# Altium footprint library OT Library.PcbLib: 396 footprints (part 15 of 25)
Each footprint in its own frame and in the unit in brackets; x right, y up, seen from the top. Pads: shape width x height; smd on the part's side, far side on the other; paste and mask are expansions set on the pad; w line width, h text height; cw(c..) or ccw(c..) is an arc to the next point about the centre after c.
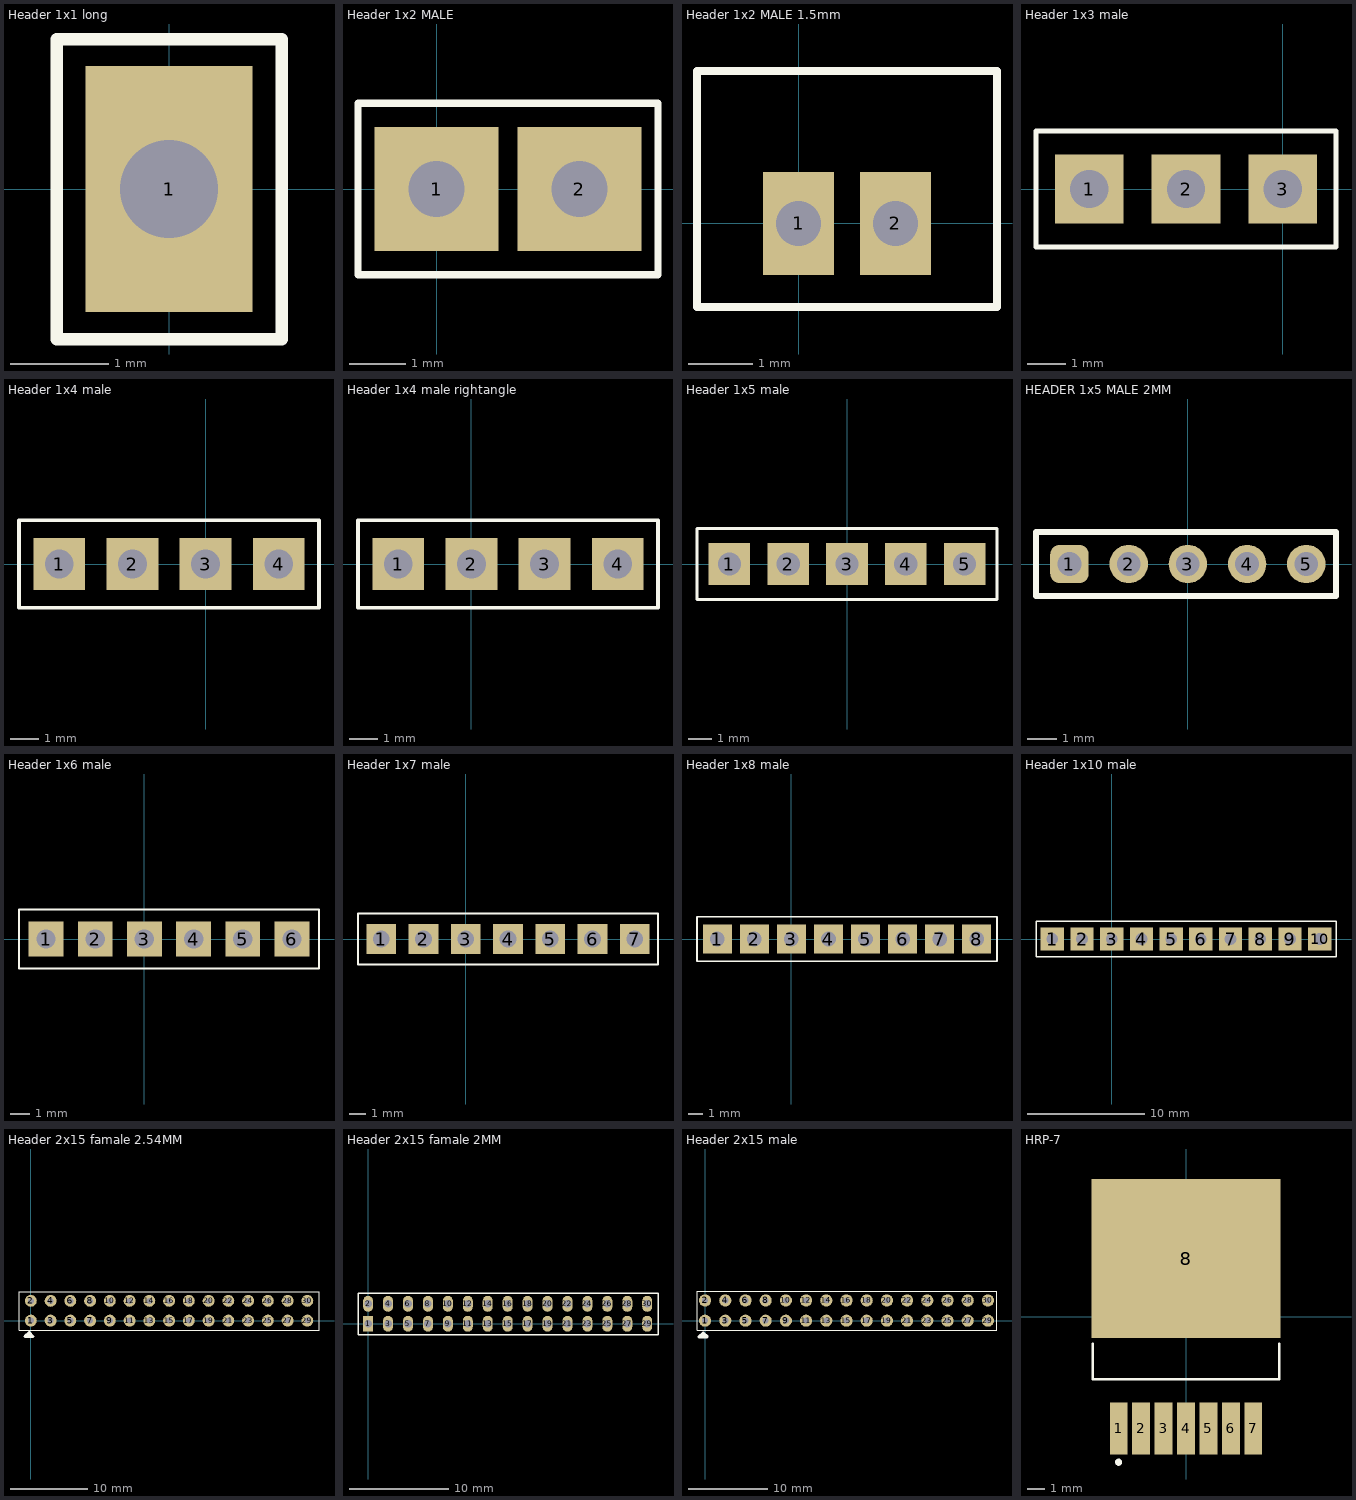
[diagram p14: the footprints below, top view; thin cyan lines are the x and y axes]

## Header 1x1 long [mm] "2.54mm"
pads (1):
  rect 1.7x2.5 hole 1: 1(0,0)
Top Overlay:
  lines w0.127: -1.143,-1.524 -1.143,1.524 1.143,1.524 1.143,-1.524 -1.143,-1.524

## Header 1x2 MALE [mm] "2.54mm"
pads (2):
  rect 2.2x2.2 hole 1: 1(0,0) 2(2.54,0)
Top Overlay:
  lines w0.127: -1.397,-1.524 3.937,-1.524 3.937,1.524 -1.397,1.524 -1.397,-1.524
3D body: height 8.57, standoff -2.97, extent -1.27,-1.27 3.81,1.27

## Header 1x2 MALE 1.5mm [mm] "1.5mm"
pads (2):
  rect 1.1x1.6 hole 0.7: 1(0,0) 2(1.5,0)
Top Overlay:
  lines w0.127: -1.575,-1.295 -1.575,2.362 3.073,2.362 3.073,-1.295 -1.575,-1.295
3D body: height 4.5, standoff -2.7, extent -1.503,-1.214 2.997,2.286

## Header 1x3 male [mm] "2.54mm"
pads (3):
  rect 1.8x1.8 hole 1: 1(-5.08,0) 2(-2.54,0) 3(0,0)
Top Overlay:
  lines w0.127: -6.477,-1.524 -6.477,1.524 1.397,1.524 1.397,-1.524 -6.477,-1.524
3D body: height 8.6, standoff -3, extent -6.35,-1.27 1.27,1.27

## Header 1x4 male [mm] "2.54mm"
pads (4):
  rect 1.8x1.8 hole 1: 1(-5.08,0) 2(-2.54,0) 3(0,0) 4(2.54,0)
Top Overlay:
  lines w0.127: -6.477,-1.524 -6.477,1.524 3.937,1.524 3.937,-1.524 -6.477,-1.524
3D body: height 8.6, standoff -3, extent -6.35,-1.27 3.81,1.27

## Header 1x4 male rightangle [mm]
pads (4):
  rect 1.8x1.8 hole 1: 1(-2.54,0) 2(0,0) 3(2.54,0) 4(5.08,0)
Top Overlay:
  lines w0.127: -3.937,-1.524 6.477,-1.524 6.477,1.524 -3.937,1.524 -3.937,-1.524
3D body: height 2.64, standoff -2.9, extent -3.81,-0.375 6.35,9.975

## Header 1x5 male [mm] "2.54mm"
pads (5):
  rect 1.8x1.8 hole 1: 1(-5.08,0) 2(-2.54,0) 3(0,0) 4(2.54,0) 5(5.08,0)
Top Overlay:
  lines w0.127: -6.477,-1.524 -6.477,1.524 6.477,1.524 6.477,-1.524 -6.477,-1.524
3D body: height 8.6, standoff -3, extent -6.35,-1.27 6.35,1.27

## HEADER 1x5 MALE 2MM [mm] "Pin Header, pitch 2.00 mm, THT, Vertical, single row, 5p"
height 6.35
pads (5):
  rrect50% 1.3x1.3 hole 0.8: 1(-4,0)
  round 1.3 hole 0.8: 2(-2,0) 3(0,0) 4(2,0) 5(4,0)
Top Overlay:
  lines w0.2: -5.131,-1.075 5.004,-1.075 5.004,1.075 -5.131,1.075 -5.131,-1.075
3D body: height 5.95, standoff -2.75, extent -5.041,-1.035 4.959,0.965

## Header 1x6 male [mm] "2.54mm"
pads (6):
  rect 1.8x1.8 hole 1: 1(-5.08,0) 2(-2.54,0) 3(0,0) 4(2.54,0) 5(5.08,0) 6(7.62,0)
Top Overlay:
  lines w0.127: -6.477,-1.524 9.017,-1.524 9.017,1.524 -6.477,1.524 -6.477,-1.524
3D body: height 8.6, standoff -3, extent -6.35,-1.27 8.89,1.27

## Header 1x7 male [mm] "2.54mm"
pads (7):
  rect 1.8x1.8 hole 1: 1(-5.08,0) 2(-2.54,0) 3(0,0) 4(2.54,0) 5(5.08,0) 6(7.62,0) 7(10.16,0)
Top Overlay:
  lines w0.127: -6.477,-1.524 -6.477,1.524 11.557,1.524 11.557,-1.524 -6.477,-1.524
3D body: height 8.6, standoff -3, extent -6.35,-1.27 11.43,1.27

## Header 1x8 male [mm] "2.54mm"
pads (8):
  rect 2x2 hole 1: 1(-5.08,0) 2(-2.54,0) 3(0,0) 4(2.54,0) 5(5.08,0) 6(7.62,0) 7(10.16,0) 8(12.7,0)
Top Overlay:
  lines w0.127: -6.477,-1.524 14.097,-1.524 14.097,1.524 -6.477,1.524 -6.477,-1.524
3D body: height 8.6, standoff -3, extent 8.89,-1.27 13.97,1.27
3D body: height 8.6, standoff -3, extent -6.35,-1.27 8.89,1.27

## Header 1x10 male [mm] "2.54mm"
pads (10):
  rect 2x2 hole 1: 1(-5.08,0) 2(-2.54,0) 3(0,0) 4(2.54,0) 5(5.08,0) 6(7.62,0) 7(10.16,0) 8(12.7,0) 9(15.24,0) 10(17.78,0)
Top Overlay:
  lines w0.127: -6.477,-1.524 -6.477,1.524 19.177,1.524 19.177,-1.524 -6.477,-1.524
3D body: height 8.6, standoff -3, extent 8.89,-1.27 19.05,1.27
3D body: height 8.6, standoff -3, extent -6.35,-1.27 8.89,1.27

## Header 2x15 famale 2.54MM [mil] "2.54mm"
pads (30):
  round 60 hole 30: 1(0,0) 2(0,100) 3(100,0) 4(100,100) 5(200,0) 6(200,100) 7(300,0) 8(300,100) 9(400,0) 10(400,100) 11(500,0) 12(500,100) 13(600,0) 14(600,100) 15(700,0) 16(700,100) 17(800,0) 18(800,100) 19(900,0) 20(900,100) 21(1000,0) 22(1000,100) 23(1100,0) 24(1100,100) 25(1200,0) 26(1200,100) 27(1300,0) 28(1300,100) 29(1400,0) 30(1400,100)
Top Overlay:
  lines w5: -60,-50 -60,147 1459,147 1459,-50 -60,-50
  lines w15.75: -30,-80 10,-80 -8,-61 -30,-80
3D body: height 335, standoff -134, extent -59.99,-50.99 1460.01,149.01

## Header 2x15 famale 2MM [mm] "2mm"
pads (30):
  rect 1x1.6 hole 0.762: 1(0,0)
  oval 1x1.6 hole 0.762: 2(0,2) 3(2,0) 4(2,2) 5(4,0) 6(4,2) 7(6,0) 8(6,2) 9(8,0) 10(8,2) 11(10,0) 12(10,2) 13(12,0) 14(12,2) 15(14,0) 16(14,2) 17(16,0) 18(16,2) 19(18,0) 20(18,2) 21(20,0) 22(20,2) 23(22,0) 24(22,2) 25(24,0) 26(24,2) 27(26,0) 28(26,2) 29(28,0) 30(28,2)
Top Overlay:
  lines w0.127: -1.016,-1.118 -1.016,3.073 29.083,3.073 29.083,-1.118 -1.016,-1.118
3D body: height 4.44, standoff -1.91, extent -1.067,-1.143 29.123,3.047

## Header 2x15 male [mil] "2.54mm"
pads (30):
  round 60 hole 30: 1(0,0) 2(0,100) 3(100,0) 4(100,100) 5(200,0) 6(200,100) 7(300,0) 8(300,100) 9(400,0) 10(400,100) 11(500,0) 12(500,100) 13(600,0) 14(600,100) 15(700,0) 16(700,100) 17(800,0) 18(800,100) 19(900,0) 20(900,100) 21(1000,0) 22(1000,100) 23(1100,0) 24(1100,100) 25(1200,0) 26(1200,100) 27(1300,0) 28(1300,100) 29(1400,0) 30(1400,100)
Top Overlay:
  lines w5: -40,-47 1445,-47 1445,146 -40,146 -40,-47
  lines w15.75: -30,-80 -8,-61 10,-80 -30,-80
3D body: height 329.53, standoff -95.66, extent -42.12,-45.07 1442.13,145.08

## HRP-7 [mm] "HRP-7 (7 Leads + Tab)"
pads (8):
  rect 1x2.94 smd: 1(-3.81,-6.31) 2(-2.54,-6.31) 3(-1.27,-6.31) 4(0,-6.31) 5(1.27,-6.31) 6(2.54,-6.31) 7(3.81,-6.31)
  rect 10.71x8.99 smd paste-6: 8(0,3.28)
Top Overlay:
  circle w0.2: c-3.81,-8.23 r0.1
  lines w0.127: -5.27,-1.532 -5.27,-3.541 5.27,-3.541 5.27,-1.532
Top Paste:
  region: 5.13,-0.933 3.82,-0.933 3.82,0.298 5.13,0.298
  region: 5.13,0.867 3.82,0.867 3.82,2.097 5.13,2.097
  region: 5.13,2.668 3.82,2.668 3.82,3.898 5.13,3.898
  region: 5.13,4.467 3.82,4.467 3.82,5.697 5.13,5.697
  region: 3.34,-0.933 2.03,-0.933 2.03,0.298 3.34,0.298
  region: 3.34,0.867 2.03,0.867 2.03,2.097 3.34,2.097
  region: 3.34,2.668 2.03,2.668 2.03,3.898 3.34,3.898
  region: 3.34,4.467 2.03,4.467 2.03,5.697 3.34,5.697
  region: 1.55,-0.933 0.24,-0.933 0.24,0.298 1.55,0.298
  region: 1.55,0.867 0.24,0.867 0.24,2.097 1.55,2.097
  region: 1.55,2.668 0.24,2.668 0.24,3.898 1.55,3.898
  region: 1.55,4.467 0.24,4.467 0.24,5.697 1.55,5.697
  region: -0.24,-0.933 -1.55,-0.933 -1.55,0.298 -0.24,0.298
  region: -0.24,0.867 -1.55,0.867 -1.55,2.097 -0.24,2.097
  region: -0.24,2.668 -1.55,2.668 -1.55,3.898 -0.24,3.898
  region: -0.24,4.467 -1.55,4.467 -1.55,5.697 -0.24,5.697
  region: -2.03,-0.933 -3.34,-0.933 -3.34,0.298 -2.03,0.298
  region: -2.03,0.867 -3.34,0.867 -3.34,2.097 -2.03,2.097
  region: -2.03,2.668 -3.34,2.668 -3.34,3.898 -2.03,3.898
  region: -2.03,4.467 -3.34,4.467 -3.34,5.697 -2.03,5.697
  region: -3.82,-0.933 -5.13,-0.933 -5.13,0.298 -3.82,0.298
  region: -3.82,0.867 -5.13,0.867 -5.13,2.097 -3.82,2.097
  region: -3.82,2.668 -5.13,2.668 -5.13,3.898 -3.82,3.898
  region: -3.82,4.467 -5.13,4.467 -5.13,5.697 -3.82,5.697
  region: 5.13,6.268 3.82,6.268 3.82,7.498 5.13,7.498
  region: 3.34,6.268 2.03,6.268 2.03,7.498 3.34,7.498
  region: 1.55,6.268 0.24,6.268 0.24,7.498 1.55,7.498
  region: -0.24,6.268 -1.55,6.268 -1.55,7.498 -0.24,7.498
  region: -2.03,6.268 -3.34,6.268 -3.34,7.498 -2.03,7.498
  region: -3.82,6.268 -5.13,6.268 -5.13,7.498 -3.82,7.498
3D body: height 1.91, standoff -0.08, extent -4.695,-5.969 4.695,4.571